# Altium footprint library Gate Driver Board.PcbLib: 117 footprints (part 5 of 8)
Each footprint in its own frame and in the unit in brackets; x right, y up, seen from the top. Pads: shape width x height; smd on the part's side, far side on the other; paste and mask are expansions set on the pad; w line width, h text height; cw(c..) or ccw(c..) is an arc to the next point about the centre after c.
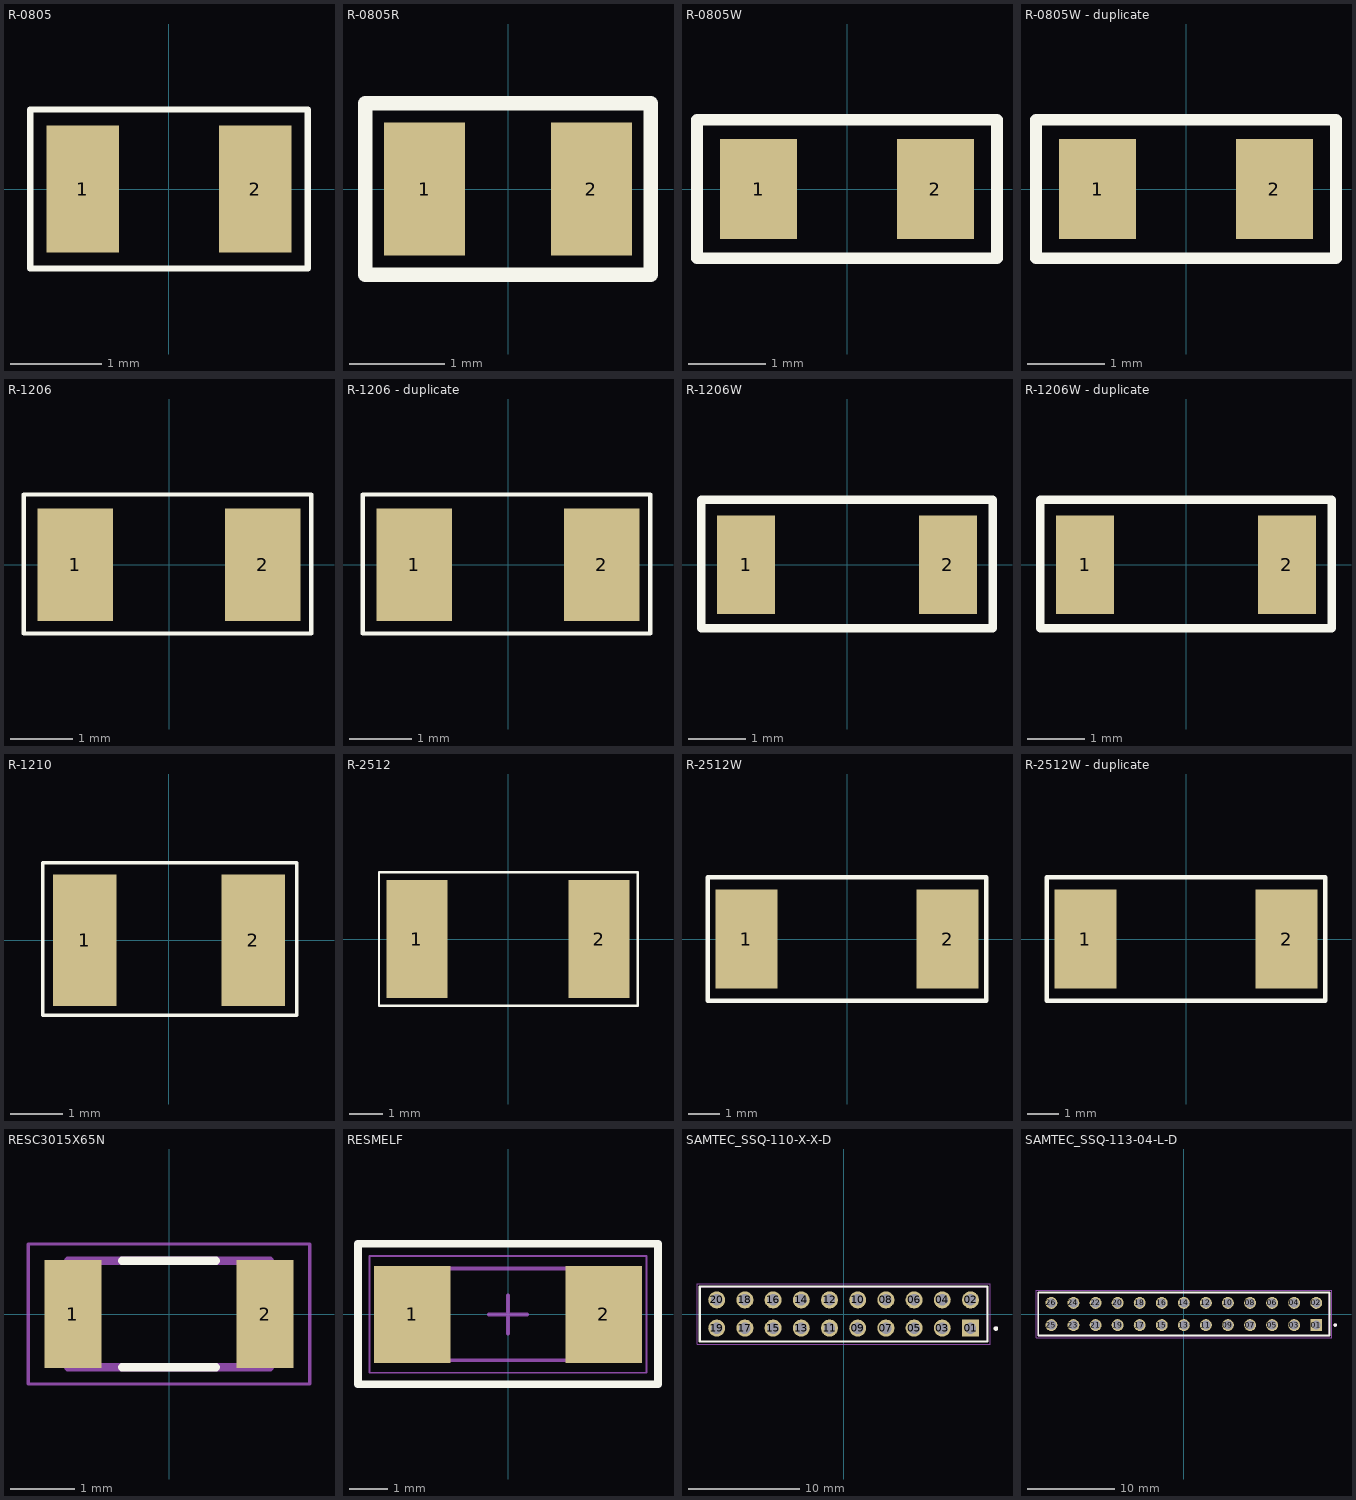
[diagram p4: the footprints below, top view; thin cyan lines are the x and y axes]

## R-0805 [mm]
pads (2):
  rect 0.8x1.4 smd: 1(-0.95,0) 2(0.95,0)
Top Overlay:
  lines w0.07: -1.525,-0.875 -1.525,0.875 1.525,0.875 1.525,-0.875 -1.525,-0.875
3D body "User Library-CR2012-0805.STEP": height 0.56, standoff -0.04, extent -1,-0.625 1,0.625

## R-0805R [mm] "resistor 0805 reflow soldering"
pads (2):
  rect 0.85x1.4 smd: 1(-0.875,0) 2(0.875,0)
Top Overlay:
  lines w0.152: -1.5,-0.9 0.6,-0.9 1.5,-0.9 1.5,0.9 0.55,0.9 -1.5,0.9 -1.5,-0.9
3D body "RES0805.stp": height 0.5, standoff 0, extent -1,-0.625 1,0.625

## R-0805W [mm] "resistor 0805 wave soldering"
pads (2):
  rect 1x1.3 smd: 1(-1.15,0) 2(1.15,0)
Top Overlay:
  lines w0.152: -1.95,-0.9 -0.9,-0.9 1.95,-0.9 1.95,0.9 -0.9,0.9 -1.95,0.9 -1.95,-0.9
3D body "RES0805.stp": height 0.5, standoff 0, extent -1,-0.625 1,0.625

## R-0805W - duplicate [mm] "resistor 0805 wave soldering"
pads (2):
  rect 1x1.3 smd: 1(-1.15,0) 2(1.15,0)
Top Overlay:
  lines w0.152: -1.95,-0.9 -1.95,0.9 -0.9,0.9 1.95,0.9 1.95,-0.9 -0.9,-0.9 -1.95,-0.9
3D body "RES0805.stp": height 0.5, standoff 0, extent -1,-0.625 1,0.625

## R-1206 [mm]
pads (2):
  rect 1.2x1.8 smd: 1(-1.5,0) 2(1.5,0)
Top Overlay:
  lines w0.07: -0.275,-1.1 2.275,-1.1 ; -0.275,-1.1 -2.325,-1.1 -2.325,0.625 -2.325,1.125 -1.175,1.125 1.125,1.125 2.275,1.125 2.275,-1.1 ; -0.275,-1.1 2.275,-1.1
3D body "User Library-CR3216-1206.step": height 0.56, standoff -0.04, extent -1.6,-0.775 1.6,0.825

## R-1206 - duplicate [mm]
pads (2):
  rect 1.2x1.8 smd: 1(-1.5,0) 2(1.5,0)
Top Overlay:
  lines w0.07: -0.275,-1.1 2.275,-1.1 ; -0.275,-1.1 -2.325,-1.1 -2.325,0.625 -2.325,1.125 -1.175,1.125 1.125,1.125 2.275,1.125 2.275,-1.1 ; -0.275,-1.1 2.275,-1.1
3D body "User Library-CR3216-1206.step": height 0.56, standoff -0.04, extent -1.6,-0.775 1.6,0.825

## R-1206W [mm] "resistor 1206 wave soldering"
pads (2):
  rect 1x1.7 smd: 1(-1.75,0) 2(1.75,0)
Top Overlay:
  lines w0.152: -2.525,-1.1 2.525,-1.1 2.525,1.125 1.605,1.125 -2.525,1.125 -2.525,-1.1
3D body "RES1206.stp": height 0.55, standoff 0, extent -1.55,-0.775 1.55,0.777

## R-1206W - duplicate [mm] "resistor 1206 wave soldering"
pads (2):
  rect 1x1.7 smd: 1(-1.75,0) 2(1.75,0)
Top Overlay:
  lines w0.152: -2.525,-1.1 -2.525,1.125 1.605,1.125 2.525,1.125 2.525,-1.1 -2.525,-1.1
3D body "RES1206.stp": height 0.55, standoff 0, extent -1.55,-0.775 1.55,0.777

## R-1210 [mm]
pads (2):
  rect 1.2x2.5 smd: 1(-1.6,0) 2(1.6,0)
Top Overlay:
  lines w0.07: -2.4,-1.425 -1.512,-1.425 -0.038,-1.425 2.425,-1.425 2.425,1.475 -2.4,1.475 -2.4,0.9 -2.4,-1.425

## R-2512 [mm]
pads (2):
  rect 1.8x3.5 smd: 1(-2.7,0) 2(2.7,0)
Top Overlay:
  lines w0.07: -3.825,-1.975 -3.825,0.525 -3.825,1.975 3.85,1.975 3.85,-1.975 -3.825,-1.975
3D body "User Library-R SMD 2512.STEP": height 0.59, standoff -0.01, extent -3.206,-1.575 3.094,1.575

## R-2512W [mm] "resistor 2512 wave soldering"
pads (2):
  rect 2x3.2 smd: 1(-3.25,0) 2(3.25,0)
Top Overlay:
  lines w0.152: -4.5,-2 2.15,-2 4.5,-2 4.5,2 2.15,2 -4.5,2 -4.5,-2
3D body "res2512.stp": height 0.55, standoff 0, extent -3.15,-1.55 3.15,1.55

## R-2512W - duplicate [mm] "resistor 2512 wave soldering"
pads (2):
  rect 2x3.2 smd: 1(-3.25,0) 2(3.25,0)
Top Overlay:
  lines w0.152: -4.5,-2 -4.5,2 2.15,2 4.5,2 4.5,-2 2.15,-2 -4.5,-2
3D body "res2512.stp": height 0.55, standoff 0, extent -3.15,-1.55 3.15,1.55

## RESC3015X65N [mm]
pads (2):
  rect 0.89x1.68 smd: 1(-1.495,0) 2(1.495,0)
Top Overlay:
  lines w0.127: -0.73,-0.83 0.73,-0.83 ; -0.73,0.83 0.73,0.83
Mechanical 13:
  lines w0.127: -1.57,-0.83 -1.57,0.83 1.57,0.83 1.57,-0.83 -1.57,-0.83
Mechanical 15:
  lines w0.05: -2.19,-1.09 -2.19,1.09 2.19,1.09 2.19,-1.09 -2.19,-1.09
3D body "CRCW120647K0FKEAC.STEP": height 0.65, standoff 0, extent -1.587,-0.821 1.463,0.729

## RESMELF [mm] "MELF Resistor, 2-Leads, Body 5.85x2.30mm, IPC Medium Density"
height 2.4
pads (2):
  rect 2x2.55 smd: 1(-2.5,0) 2(2.5,0)
Top Overlay:
  lines w0.2: -3.925,-1.825 -3.925,1.85 -1.572,1.85 -0.191,1.85 2.082,1.85 ; -3.9,-1.825 -1.2,-1.825 3.925,-1.825 3.925,1.85 ; 2.082,1.85 3.925,1.85 ; 2.082,1.85 3.925,1.85
Assembly Top:
  lines w0.1: -2.95,-1.2 2.95,-1.2 2.95,1.2 -2.95,1.2 -2.95,-1.2
Courtyard Top:
  lines w0.05: -3.625,-1.525 3.625,-1.525 3.625,1.525 -3.625,1.525 -3.625,-1.525
  lines w0.1: -0.5,0 0.5,0 ; 0,-0.5 0,0.5
3D body: height 2.39, standoff 0, extent 2.4,-1.2 2.95,1.195
3D body: height 2.39, standoff 0, extent -2.95,-1.2 -2.4,1.195
3D body "User Library-MMB0207_102K.STEP": height 2.4, standoff 0, extent -2.9,-1.2 2.9,1.2

## SAMTEC_SSQ-110-X-X-D [mm]
pads (20):
  rect 1.53x1.53 hole 1.02: 01(11.43,-1.27)
  round 1.53 hole 1.02: 02(11.43,1.27) 03(8.89,-1.27) 04(8.89,1.27) 05(6.35,-1.27) 06(6.35,1.27) 07(3.81,-1.27) 08(3.81,1.27) 09(1.27,-1.27) 10(1.27,1.27) 11(-1.27,-1.27) 12(-1.27,1.27) 13(-3.81,-1.27) 14(-3.81,1.27) 15(-6.35,-1.27) 16(-6.35,1.27) 17(-8.89,-1.27) 18(-8.89,1.27) 19(-11.43,-1.27) 20(-11.43,1.27)
Top Overlay:
  circle w0.2: c13.715,-1.31 r0.1
  lines w0.2: -12.955,-2.475 -12.955,2.475 12.955,2.475 12.955,-2.475 -12.955,-2.475
Mechanical 13:
  circle w0.2: c13.715,-1.31 r0.1
  lines w0.1: -12.955,-2.475 -12.955,2.475 12.955,2.475 12.955,-2.475 -12.955,-2.475
Mechanical 15:
  lines w0.05: -13.205,-2.725 -13.205,2.725 13.205,2.725 13.205,-2.725 -13.205,-2.725
3D body "SSQ-110-24-H-D.stp": height 8.51, standoff -14.83, extent -12.954,-2.476 12.954,2.477

## SAMTEC_SSQ-113-04-L-D [mm]
pads (26):
  rect 1.37x1.37 hole 1.02: 01(15.24,-1.27)
  round 1.37 hole 1.02: 02(15.24,1.27) 03(12.7,-1.27) 04(12.7,1.27) 05(10.16,-1.27) 06(10.16,1.27) 07(7.62,-1.27) 08(7.62,1.27) 09(5.08,-1.27) 10(5.08,1.27) 11(2.54,-1.27) 12(2.54,1.27) 13(0,-1.27) 14(0,1.27) 15(-2.54,-1.27) 16(-2.54,1.27) 17(-5.08,-1.27) 18(-5.08,1.27) 19(-7.62,-1.27) 20(-7.62,1.27) 21(-10.16,-1.27) 22(-10.16,1.27) 23(-12.7,-1.27) 24(-12.7,1.27) 25(-15.24,-1.27) 26(-15.24,1.27)
Top Overlay:
  circle w0.2: c17.415,-1.27 r0.1
  lines w0.2: -16.765,-2.475 16.765,-2.475 16.765,2.475 -16.765,2.475 -16.765,-2.475
Mechanical 13:
  circle w0.2: c17.415,-1.27 r0.1
  lines w0.1: -16.765,-2.475 -16.765,2.475 ; -16.765,-2.475 16.765,-2.475 ; -16.765,-2.475 -16.765,2.475 ; -16.765,2.475 16.765,2.475 ; -16.765,2.475 16.765,2.475 ; 16.765,-2.475 16.765,2.475 ; 16.765,-2.475 16.765,2.475
Mechanical 15:
  lines w0.05: -17.015,-2.725 17.015,-2.725 17.015,2.725 -17.015,2.725 -17.015,-2.725
3D body "SSQ-113-04-L-D.stp": height 8.51, standoff -14.83, extent -16.764,-2.502 16.764,2.452